# Altium footprint library biblioteka_pcb.PcbLib: 184 footprints (part 9 of 12)
Each footprint in its own frame and in the unit in brackets; x right, y up, seen from the top. Pads: shape width x height; smd on the part's side, far side on the other; paste and mask are expansions set on the pad; w line width, h text height; cw(c..) or ccw(c..) is an arc to the next point about the centre after c.
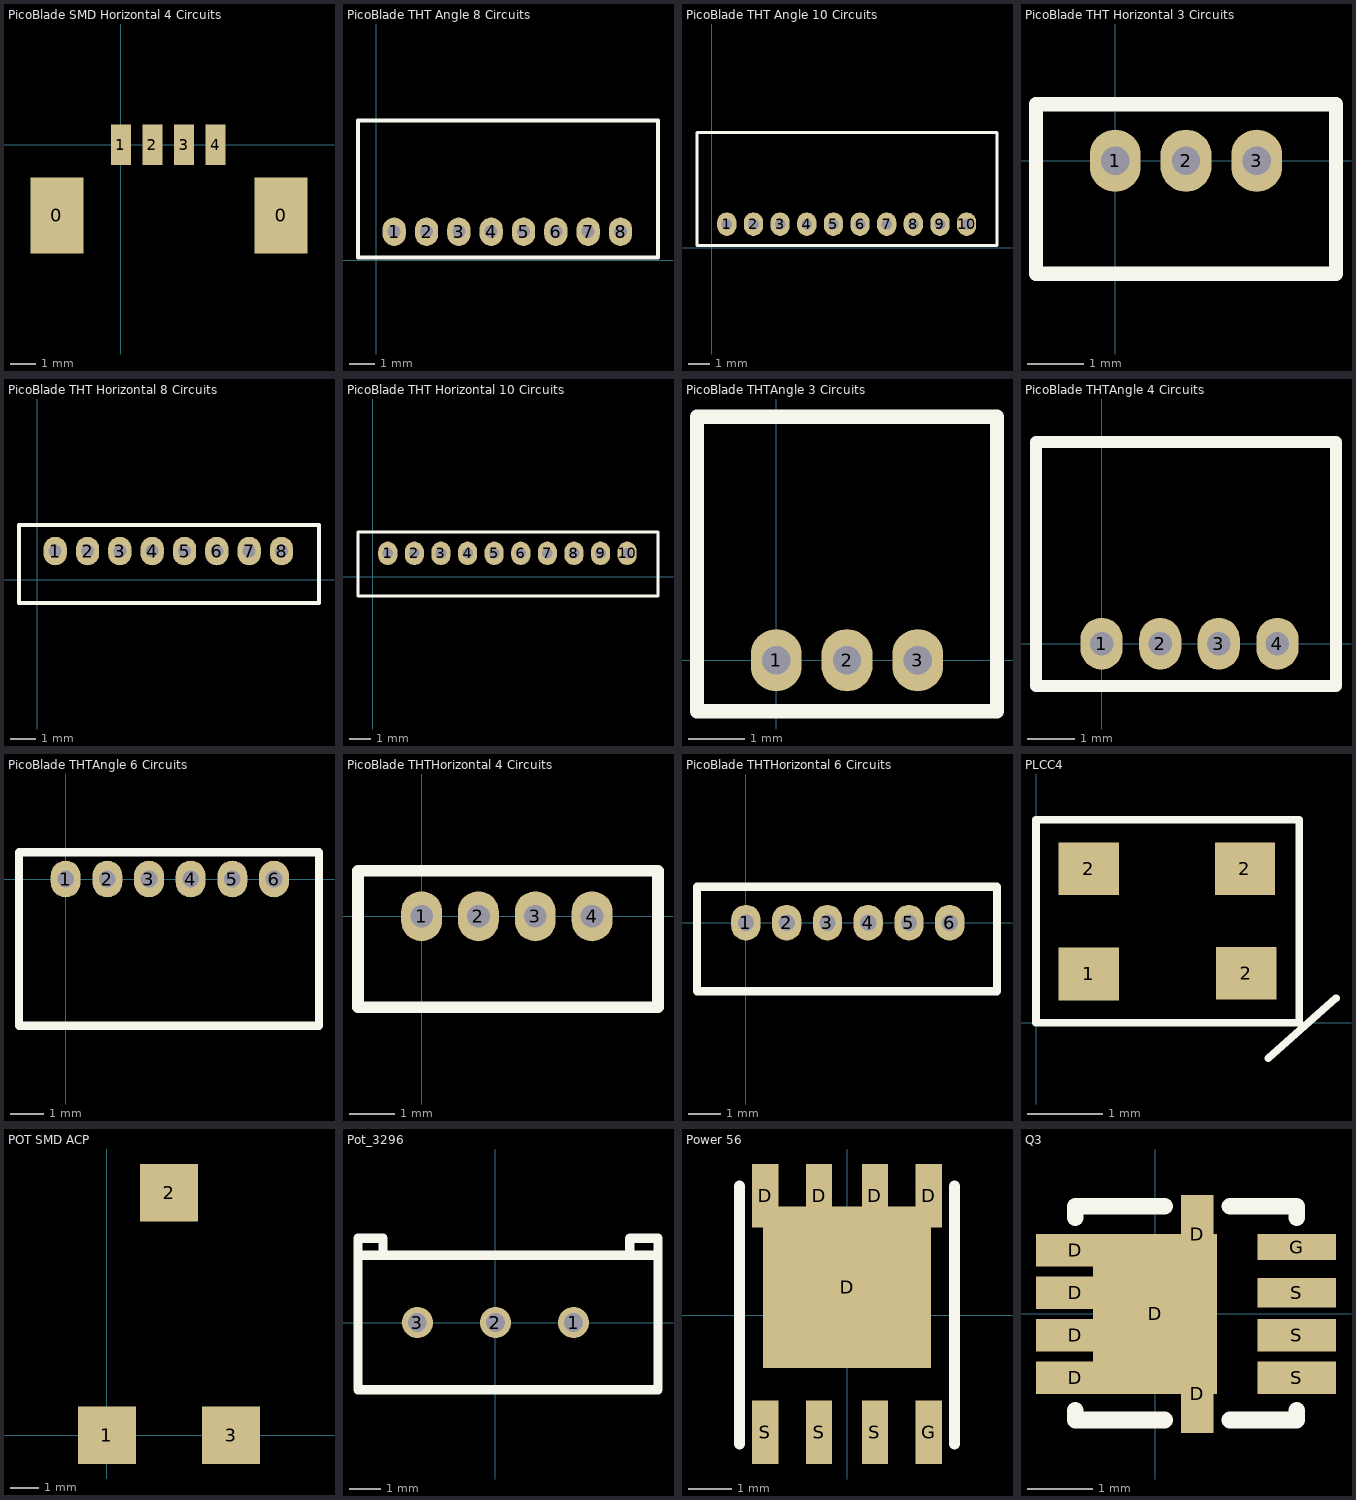
[diagram p8: the footprints below, top view; thin cyan lines are the x and y axes]

## PicoBlade SMD Horizontal 4 Circuits [mm]
pads (6):
  rect 2.1x3 smd: 0(-2.54,-2.794) 0(6.35,-2.794)
  rect 0.8x1.6 smd: 1(0,0) 2(1.25,0) 3(2.5,0) 4(3.75,0)
3D body "533980471.stp": height 4.7, standoff 0, extent -3.297,-3.882 6.853,0.318

## PicoBlade THT Angle 8 Circuits [mm]
pads (8):
  oval 0.9x1.1 hole 0.5: 1(0.7,1.1) 2(1.95,1.1) 3(3.2,1.1) 4(4.45,1.1) 5(5.7,1.1) 6(6.95,1.1) 7(8.2,1.1) 8(9.45,1.1)
Top Overlay:
  lines w0.152: -0.7,0.1 -0.7,5.4 10.9,5.4 10.9,0.1 -0.7,0.1
3D body "530480810.stp": height 3.5, standoff -2.3, extent -0.775,0 10.975,5.5

## PicoBlade THT Angle 10 Circuits [mm]
pads (10):
  oval 0.9x1.1 hole 0.5: 1(0.7,1.1) 2(1.95,1.1) 3(3.2,1.1) 4(4.45,1.1) 5(5.7,1.1) 6(6.95,1.1) 7(8.2,1.1) 8(9.45,1.1) 9(10.7,1.1) 10(11.95,1.1)
Top Overlay:
  lines w0.152: -0.7,0.1 -0.7,5.4 13.375,5.4 13.375,0.1 -0.7,0.1

## PicoBlade THT Horizontal 3 Circuits [mm]
pads (3):
  oval 0.9x1.1 hole 0.5: 1(0,0) 2(1.25,0) 3(2.5,0)
Top Overlay:
  lines w0.254: -1.4,-2 -1.4,1 3.9,1 3.9,-2 -1.4,-2

## PicoBlade THT Horizontal 8 Circuits [mm]
pads (8):
  oval 0.9x1.1 hole 0.5: 1(0.7,1.1) 2(1.95,1.1) 3(3.2,1.1) 4(4.45,1.1) 5(5.7,1.1) 6(6.95,1.1) 7(8.2,1.1) 8(9.45,1.1)
Top Overlay:
  lines w0.152: -0.7,-0.9 10.9,-0.9 10.9,2.1 -0.7,2.1 -0.7,-0.9
3D body "530470810.stp": height 4.2, standoff -2.2, extent -0.775,-1 10.975,2.2

## PicoBlade THT Horizontal 10 Circuits [mm]
pads (10):
  oval 0.9x1.1 hole 0.5: 1(0.7,1.1) 2(1.95,1.1) 3(3.2,1.1) 4(4.45,1.1) 5(5.7,1.1) 6(6.95,1.1) 7(8.2,1.1) 8(9.45,1.1) 9(10.7,1.1) 10(11.95,1.1)
Top Overlay:
  lines w0.152: -0.7,-0.9 -0.7,2.1 13.4,2.1 13.4,-0.9 -0.7,-0.9

## PicoBlade THTAngle 3 Circuits [mm]
pads (3):
  oval 0.9x1.1 hole 0.5: 1(0,0) 2(1.25,0) 3(2.5,0)
Top Overlay:
  lines w0.254: -1.4,-0.9 -1.4,4.3 3.9,4.3 3.9,-0.9 -1.4,-0.9

## PicoBlade THTAngle 4 Circuits [mm]
pads (4):
  oval 0.9x1.1 hole 0.5: 1(0,0) 2(1.25,0) 3(2.5,0) 4(3.75,0)
Top Overlay:
  lines w0.254: -1.4,-0.9 5,-0.9 5,4.3 -1.4,4.3 -1.4,-0.9
3D body "530480410.stp": height 3.5, standoff -2.3, extent -1.55,-1.05 5.2,4.45

## PicoBlade THTAngle 6 Circuits [mm]
pads (6):
  oval 0.9x1.1 hole 0.5: 1(0,0) 2(1.25,0) 3(2.5,0) 4(3.75,0) 5(5,0) 6(6.25,0)
Top Overlay:
  lines w0.254: -1.4,-4.4 -1.4,0.8 7.6,0.8 7.6,-4.4 -1.4,-4.4
3D body "530480610.stp": height 3.5, standoff -2.3, extent -1.525,-4.55 7.725,0.95

## PicoBlade THTHorizontal 4 Circuits [mm]
pads (4):
  oval 0.9x1.1 hole 0.5: 1(0,0) 2(1.25,0) 3(2.5,0) 4(3.75,0)
Top Overlay:
  lines w0.254: -1.4,-2 5.2,-2 5.2,1 -1.4,1 -1.4,-2
3D body "530470410.stp": height 4.2, standoff -2.2, extent -1.475,-2.1 5.275,1.1

## PicoBlade THTHorizontal 6 Circuits [mm]
pads (6):
  oval 0.9x1.1 hole 0.5: 1(0,0) 2(1.25,0) 3(2.5,0) 4(3.75,0) 5(5,0) 6(6.25,0)
Top Overlay:
  lines w0.254: -1.5,-2.1 -1.5,1.1 7.7,1.1 7.7,-2.1 -1.5,-2.1
3D body "530470610.stp": height 4.2, standoff -2.2, extent -1.525,-2.1 7.725,1.1

## PLCC4 [mm] "Pin 1 -  Anoda(+) Pin 2 - Katoda(-) (3 pins common)"
pads (4):
  rect 0.8x0.7 smd: 1(0.702,0.651) 2(0.702,2.051) 2(2.776,2.051) 2(2.794,0.66)
Top Overlay:
  lines w0.1: 3.088,-0.47 3.988,0.33 ; 0,0 3.5,0 3.5,2.7 0,2.7 0,0

## POT SMD ACP [mm]
pads (3):
  rect 2x2 smd: 1(0,0) 2(2.15,8.4) 3(4.3,0)
3D body "ACP CA6.stp": height 3.9, standoff 0, extent -1.1,-0.5 5.4,9.2

## Pot_3296 [mm] "Bochen 3296 Pin2 - Wiper"
pads (3):
  rrect100% 1x1 hole 0.6: 1(2.5,0) 2(0,0) 3(-2.5,0)
Top Overlay:
  lines w0.3: -4.4,2.1 -4.4,2.7 -3.6,2.7 -3.6,2.2 ; 4.3,2.2 4.3,2.7 5.2,2.7 5.2,2.1 ; -4.4,-2.15 -4.4,2.15 5.2,2.15 5.2,-2.15 -4.4,-2.15
3D body: height 16, standoff 10, extent 3.1,-1.9 5.092,0.096
3D body: height 3, standoff 0, extent 2.2,-0.3 2.798,0.299
3D body: height 3, standoff 0, extent -0.3,-0.3 0.298,0.299
3D body: height 3, standoff 0, extent -2.8,-0.3 -2.202,0.299
3D body: height 14, standoff 3, extent -4.4,-2.1 5.2,2.1
3D body: height 14, standoff 3, extent -4.4,2.1 -3.6,2.7
3D body: height 14, standoff 3, extent 4.4,2.1 5.2,2.7

## Power 56 [mm]
pads (9):
  rect 0.61x1.47 smd: D(-1.9,2.775) D(-0.65,2.775) D(0.65,2.775) D(1.9,2.775) G(1.9,-2.725) S(-1.9,-2.725) S(-0.65,-2.725) S(0.65,-2.725)
  rect 3.91x3.75 smd: D(0,0.65)
Top Overlay:
  lines w0.254: -2.5,-3 -2.5,3 ; 2.5,-3 2.5,3

## Q3 [mm]
pads (11):
  rect 1.2x0.5 smd: D(-1.225,-0.975) D(-1.225,-0.325) D(-1.225,0.325) D(-1.225,0.975) S(2.175,-0.975) S(2.175,-0.325)
  rect 1.9x2.45 smd: D(0,0)
  rect 0.5x1.2 smd: D(0.65,-1.225) D(0.65,1.225)
  rect 1.2x0.4 smd: G(2.175,1.025)
  rect 1.2x0.45 smd: S(2.175,0.325)
Top Overlay:
  lines w0.254: -1.225,-1.475 -1.225,-1.625 0.15,-1.625 ; -1.225,1.475 -1.225,1.65 0.15,1.65 ; 1.15,-1.625 2.175,-1.625 2.175,-1.475 ; 1.15,1.65 2.175,1.65 2.175,1.475